# Altium footprint library PcbLib1.PcbLib: 7 footprints
Each footprint in its own frame and in the unit in brackets; x right, y up, seen from the top. Pads: shape width x height; smd on the part's side, far side on the other; paste and mask are expansions set on the pad; w line width, h text height; cw(c..) or ccw(c..) is an arc to the next point about the centre after c.
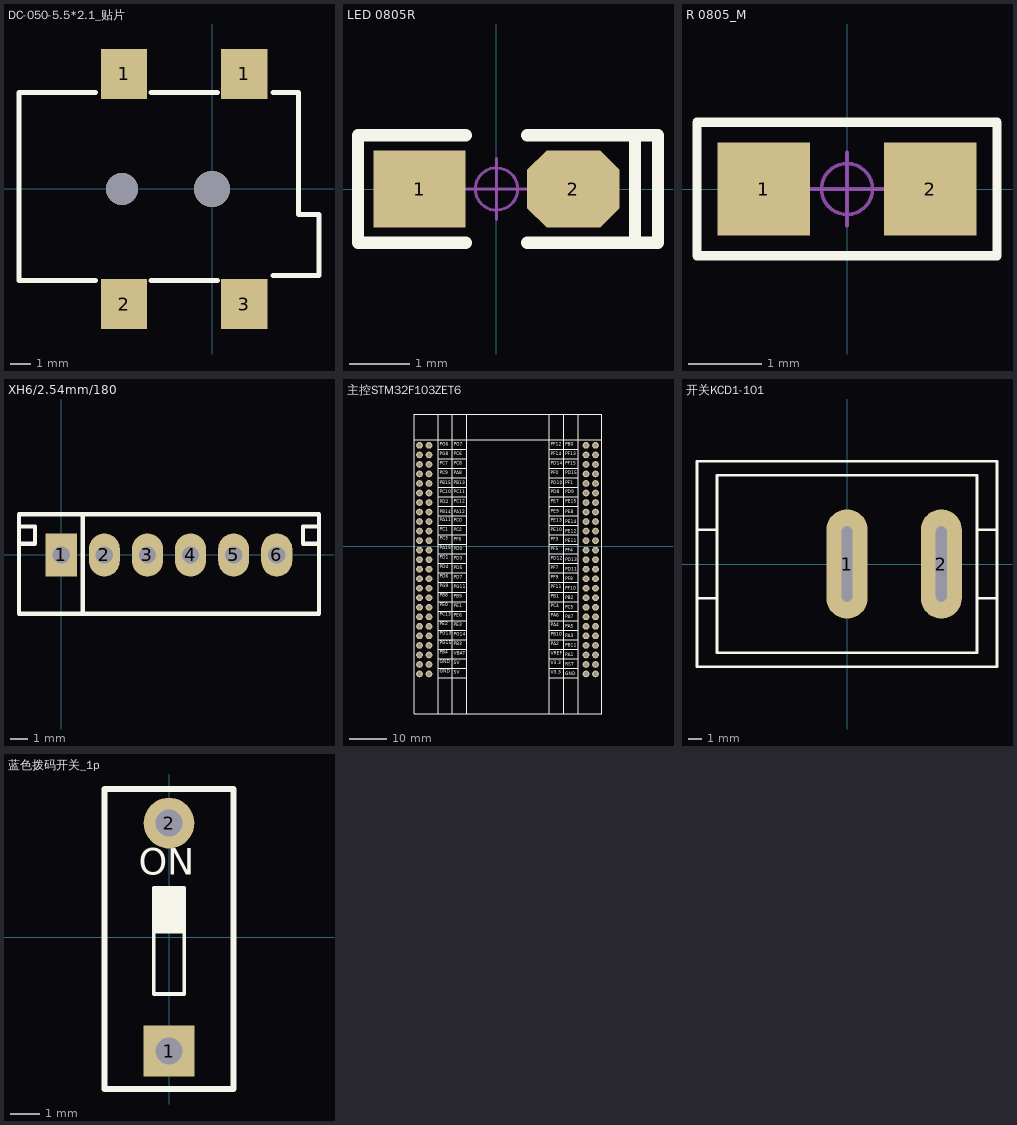
[diagram p0: the footprints below, top view; thin cyan lines are the x and y axes]

## DC-050-5.5*2.1_贴片 [mm] "5.5*2.1"
pads (4):
  rect 2.3x2.5 smd: 1(-4.4,5.75) 1(1.6,5.75) 2(-4.4,-5.75) 3(1.6,-5.75)
via 0,0 diameter 1.8 hole 1.8
via -4.5,0 diameter 1.6 hole 1.6
Top Overlay:
  lines w0.254: -5.842,-4.572 -9.652,-4.572 -9.652,4.826 -5.842,4.826 ; -3.048,-4.572 0.254,-4.572 ; -3.048,4.826 0.254,4.826 ; 3.048,-4.318 5.334,-4.318 5.334,-1.27 4.318,-1.27 4.318,4.826 3.048,4.826
3D body "DC-050.STEP": height 11, standoff -1.4, extent -9.593,-6.3 5.207,6.3

## LED 0805R [mil] "红色0805LED"
pads (2):
  rect 60x50 smd: 1(-50,0)
  oct 60x50 smd: 2(50,0)
Top Overlay:
  lines w8: -20,-35 -90,-35 -90,35 -20,35 ; 20,-35 105,-35 105,35 20,35 ; 90,-35 90,35
Mechanical 15:
  circle w1.97: c0,0 r13.78
  lines w1.97: -19.68,0 19.68,0 ; 0,-19.68 0,19.68
3D body "LED 0805玻璃罩.ST": height 31.69, standoff 12.01, extent -29.49,-24.65 29.49,24.65
3D body "LED 0805-R.STEP": height 26.33, standoff -0.16, extent -39.37,-24.65 39.37,24.64

## R 0805_M [mil] "1/8W贴片电阻"
pads (2):
  rect 50x50 smd: 1(-45,0) 2(45,0)
Top Overlay:
  lines w5: -81,-36 -81,36 81,36 81,-36 -81,-36
Mechanical 15:
  circle w1.97: c0,0 r13.78
  lines w1.97: -19.68,0 19.68,0 ; 0,-19.68 0,19.68
3D body "R 0805.STEP": height 19.72, standoff -0.24, extent -39.37,-24.61 39.37,24.61

## XH6/2.54mm/180 [mm]
pads (6):
  rect 1.8x2.5 hole 1: 1(0,0)
  oval 1.8x2.5 hole 1: 2(2.5,0) 3(5,0) 4(7.5,0) 5(10,0) 6(12.5,0)
Top Overlay:
  lines w0.254: -2.45,0.65 -1.524,0.65 -1.524,1.65 -2.45,1.65 ; 1.25,-3.4 1.25,2.35 ; 14.95,0.65 14.024,0.65 14.024,1.65 14.95,1.65 ; -2.45,-3.4 -2.45,2.35 14.95,2.35 14.95,-3.4 -2.45,-3.4
3D body "JST-B6B-XH-A.STEP": height 7, standoff -3.4, extent -2.45,-3.4 14.95,2.35

## 主控STM32F103ZET6 [mm]
pads (100):
  round 1.8 hole 1 paste+0: 1(124.029,26.924) 2(124.029,24.384) 3(124.029,21.844) 4(124.029,19.304) 5(124.029,16.764) 6(124.029,14.224) 7(124.029,11.684) 8(124.029,9.144) 9(124.029,6.604) 10(124.029,4.064) 11(124.029,1.524) 12(124.029,-1.016) 13(124.029,-3.556) 14(124.029,-6.096) 15(124.029,-8.636) 16(124.029,-11.176) 17(124.029,-13.716) 18(124.029,-16.256) 19(124.029,-18.796) 20(124.029,-21.336) 21(124.029,-23.876) 22(124.029,-26.416) 23(124.029,-28.956) 24(124.029,-31.496) 25(124.029,-34.036) 26(121.489,-34.036) 27(121.489,-31.496) 28(121.489,-28.956) 29(121.489,-26.416) 30(121.489,-23.876) 31(121.489,-21.336) 32(121.489,-18.796) 33(121.489,-16.256) 34(121.489,-13.716) 35(121.489,-11.176) 36(121.489,-8.636) 37(121.489,-6.096) 38(121.489,-3.556) 39(121.489,-1.016) 40(121.489,1.524) 41(121.489,4.064) 42(121.489,6.604) 43(121.489,9.144) 44(121.489,11.684) 45(121.489,14.224) 46(121.489,16.764) 47(121.489,19.304) 48(121.489,21.844) 49(121.489,24.384) 50(121.489,26.924) 51(79.629,26.924) 52(79.629,24.384) 53(79.629,21.844) 54(79.629,19.304) 55(79.629,16.764) 56(79.629,14.224) 57(79.629,11.684) 58(79.629,9.144) 59(79.629,6.604) 60(79.629,4.064) 61(79.629,1.524) 62(79.629,-1.016) 63(79.629,-3.556) 64(79.629,-6.096) 65(79.629,-8.636) 66(79.629,-11.176) 67(79.629,-13.716) 68(79.629,-16.256) 69(79.629,-18.796) 70(79.629,-21.336) 71(79.629,-23.876) 72(79.629,-26.416) 73(79.629,-28.956) 74(79.629,-31.496) 75(79.629,-34.036) 76(77.089,26.924) 77(77.089,24.384) 78(77.089,21.844) 79(77.089,19.304) 80(77.089,16.764) 81(77.089,14.224) 82(77.089,11.684) 83(77.089,9.144) 84(77.089,6.604) 85(77.089,4.064) 86(77.089,1.524) 87(77.089,-1.016) 88(77.089,-3.556) 89(77.089,-6.096) 90(77.089,-8.636) 91(77.089,-11.176) 92(77.089,-13.716) 93(77.089,-16.256) 94(77.089,-18.796) 95(77.089,-21.336) 96(77.089,-23.876) 97(77.089,-26.416) 98(77.089,-28.956) 99(77.089,-31.496) 100(77.089,-34.036)
Top Overlay:
  lines w0.254: 75.692,28.448 125.603,28.448 ; 82.08,-32.498 85.763,-32.498 ; 82.08,-29.958 85.763,-29.958 ; 82.08,-27.418 85.763,-27.418 ; 82.08,-24.878 85.763,-24.878 ; 82.08,-22.338 85.763,-22.338 ; 82.08,-19.798 85.763,-19.798 ; 82.08,-17.258 85.763,-17.258 ; 82.08,-14.718 85.763,-14.718 ; 82.08,-12.178 85.763,-12.178 ; 82.08,-9.638 85.763,-9.638 ; 82.08,-7.098 85.763,-7.098 ; 82.08,-4.558 85.763,-4.558 ; 82.08,-2.018 85.763,-2.018 ; 82.08,0.522 85.763,0.522 ; 82.08,3.062 85.763,3.062 ; 82.08,5.602 85.763,5.602 ; 82.08,8.142 85.763,8.142 ; 82.08,10.682 85.763,10.682 ; 82.08,13.222 85.763,13.222 ; 82.08,15.762 85.763,15.762 ; 82.08,18.302 85.763,18.302 ; 82.08,20.842 85.763,20.842 ; 82.08,25.922 85.763,25.922 ; 82.08,28.462 85.763,28.462 ; 85.89,-32.498 89.573,-32.498 ; 85.89,-29.958 89.573,-29.958 ; 85.89,-27.418 89.573,-27.418 ; 85.89,-24.878 89.573,-24.878 ; 85.89,-22.338 89.573,-22.338 ; 85.89,-19.798 89.573,-19.798 ; 85.89,-17.258 89.573,-17.258 ; 85.89,-14.718 89.573,-14.718 ; 85.89,-12.178 89.573,-12.178 ; 85.89,-9.638 89.573,-9.638 ; 85.89,-7.098 89.573,-7.098 ; 85.89,-4.558 89.573,-4.558 ; 85.89,-2.018 89.573,-2.018 ; 85.89,0.522 89.573,0.522 ; 85.89,3.062 89.573,3.062 ; 85.89,5.602 89.573,5.602 ; 85.89,8.142 89.573,8.142 ; 85.89,10.682 89.573,10.682 ; 85.89,13.222 89.573,13.222 ; 85.89,15.762 89.573,15.762 ; 85.89,18.302 89.573,18.302 ; 85.89,20.842 89.573,20.842 ; 85.89,25.922 89.573,25.922 ; 85.89,28.462 89.573,28.462 ; 111.76,-32.498 115.443,-32.498 ; 111.76,-29.958 115.443,-29.958 ; 111.76,-27.418 115.443,-27.418 ; 111.76,-24.878 115.443,-24.878 ; 111.76,-22.338 115.443,-22.338 ; 111.76,-19.798 115.443,-19.798 ; 111.76,-17.258 115.443,-17.258 ; 111.76,-14.718 115.443,-14.718 ; 111.76,-12.178 115.443,-12.178 ; 111.76,-9.638 115.443,-9.638 ; 111.76,-7.098 115.443,-7.098 ; 111.76,-4.558 115.443,-4.558 ; 111.76,-2.018 115.443,-2.018 ; 111.76,0.522 115.443,0.522 ; 111.76,3.062 115.443,3.062 ; 111.76,5.602 115.443,5.602 ; 111.76,8.142 115.443,8.142 ; 111.76,10.682 115.443,10.682 ; 111.76,13.222 115.443,13.222 ; 111.76,15.762 115.443,15.762 ; 111.76,18.302 115.443,18.302 ; 111.76,20.842 115.443,20.842 ; 111.76,25.922 115.443,25.922 ; 111.76,28.462 115.443,28.462 ; 115.57,-32.498 119.253,-32.498 ; 115.57,-29.958 119.253,-29.958 ; 115.57,-27.418 119.253,-27.418 ; 115.57,-24.878 119.253,-24.878 ; 115.57,-22.338 119.253,-22.338 ; 115.57,-19.798 119.253,-19.798 ; 115.57,-17.258 119.253,-17.258 ; 115.57,-14.718 119.253,-14.718 ; 115.57,-12.178 119.253,-12.178 ; 115.57,-9.638 119.253,-9.638 ; 115.57,-7.098 119.253,-7.098 ; 115.57,-4.558 119.253,-4.558 ; 115.57,-2.018 119.253,-2.018 ; 115.57,0.522 119.253,0.522 ; 115.57,3.062 119.253,3.062 ; 115.57,5.602 119.253,5.602 ; 115.57,8.142 119.253,8.142 ; 115.57,10.682 119.253,10.682 ; 115.57,13.222 119.253,13.222 ; 115.57,15.762 119.253,15.762 ; 115.57,18.302 119.253,18.302 ; 115.57,20.842 119.253,20.842 ; 115.57,25.922 119.253,25.922 ; 115.57,28.462 119.253,28.462 ; 75.692,-44.71 125.692,-44.71 125.692,35.29 75.692,35.29 ; 75.692,-44.71 75.692,35.29 ; 75.692,-44.71 75.692,35.29 ; 85.852,-44.71 89.662,-44.71 89.662,35.29 85.852,35.29 ; 85.852,-44.71 85.852,35.29 ; 85.852,-44.71 85.852,35.29 ; 85.852,-44.71 85.852,35.29 ; 85.852,-44.71 82.042,-44.71 82.042,35.29 85.852,35.29 ; 115.532,-44.71 115.532,35.29 ; 115.532,-44.71 111.722,-44.71 111.722,35.29 115.532,35.29 ; 115.532,-44.71 115.532,35.29 ; 115.532,-44.71 119.38,-44.71 119.38,28.448 119.38,35.29 115.532,35.29 ; 82.08,-35.038 85.763,-35.038 82.08,-35.038 ; 82.08,23.382 85.763,23.382 82.08,23.382 ; 85.89,-35.038 89.573,-35.038 85.89,-35.038 ; 85.89,23.382 89.573,23.382 85.89,23.382 ; 111.76,-35.038 115.443,-35.038 111.76,-35.038 ; 111.76,23.382 115.443,23.382 111.76,23.382 ; 115.57,-35.038 119.253,-35.038 115.57,-35.038 ; 115.57,23.382 119.253,23.382 115.57,23.382
  text "PF12" at 112.141,26.392 h1.52
  text "PF14" at 112.141,23.852 h1.52
  text "PD14" at 112.141,21.312 h1.52
  text "PF0" at 112.141,18.785 h1.52
  text "PD10" at 112.141,16.118 h1.52
  text "PD8" at 112.141,13.705 h1.52
  text "PE7" at 112.141,11.165 h1.52
  text "PE9" at 112.141,8.498 h1.52
  text "PG7" at 86.271,26.405 h1.52
  text "PC6" at 86.271,23.865 h1.52
  text "PC8" at 86.271,21.325 h1.52
  text "PA8" at 86.271,18.785 h1.52
  text "PB13" at 86.271,16.118 h1.52
  text "PC11" at 86.271,13.705 h1.52
  text "PC12" at 86.271,11.165 h1.52
  text "PA12" at 86.271,8.485 h1.52
  text "PB0" at 115.951,26.405 h1.52
  text "PF13" at 115.951,23.865 h1.52
  text "PF15" at 115.951,21.325 h1.52
  text "PD15" at 115.951,18.785 h1.52
  text "PF1" at 115.951,16.105 h1.52
  text "PD9" at 115.951,13.705 h1.52
  text "PE15" at 115.951,11.165 h1.52
  text "PG6" at 82.461,26.405 h1.52
  text "PG8" at 82.461,23.865 h1.52
  text "PC7" at 82.461,21.325 h1.52
  text "PC9" at 82.461,18.785 h1.52
  text "PB15" at 82.461,16.118 h1.52
  text "PC10" at 82.461,13.705 h1.52
  text "PD2" at 82.461,11.152 h1.52
  text "PB14" at 82.461,8.485 h1.52
  text "PA11" at 82.461,6.326 h1.52
  text "PC3" at 82.461,1.386 h1.52
  text "PA15" at 82.461,-1.154 h1.52
  text "PD1" at 82.461,-3.707 h1.52
  text "PD4" at 82.461,-6.247 h1.52
  text "PD6" at 82.461,-8.774 h1.52
  text "PG9" at 82.461,-11.314 h1.52
  text "PB8" at 82.461,-13.854 h1.52
  text "PE0" at 82.461,-16.394 h1.52
  text "PC13" at 82.461,-18.934 h1.52
  text "PE2" at 82.461,-21.487 h1.52
  text "PG13" at 82.461,-24.014 h1.52
  text "PG15" at 82.461,-26.554 h1.52
  text "PB4" at 82.461,-29.107 h1.52
  text "GND" at 82.461,-31.634 h1.52
  text "GND" at 82.461,-34.174 h1.52
  text "PC1" at 82.461,3.799 h1.52
  text "PC0" at 86.271,6.212 h1.52
  text "PC2" at 86.271,3.672 h1.52
  text "PF6" at 86.271,1.132 h1.52
  text "PD0" at 86.271,-1.408 h1.52
  text "PD3" at 86.271,-3.948 h1.52
  text "PD5" at 86.271,-6.488 h1.52
  text "PD7" at 86.271,-9.028 h1.52
  text "PG11" at 86.271,-11.568 h1.52
  text "PB9" at 86.271,-14.108 h1.52
  text "PE1" at 86.271,-16.661 h1.52
  text "PE6" at 86.271,-19.188 h1.52
  text "PE3" at 86.271,-21.728 h1.52
  text "PG14" at 86.271,-24.268 h1.52
  text "PB3" at 86.271,-26.808 h1.52
  text "VBAT" at 86.271,-29.361 h1.52
  text "5V" at 86.271,-31.888 h1.52
  text "5V" at 86.271,-34.428 h1.52
  text "PE13" at 112.052,6.212 h1.52
  text "PE10" at 112.052,3.672 h1.52
  text "PF3" at 112.052,1.132 h1.52
  text "PF5" at 112.052,-1.408 h1.52
  text "PD12" at 112.052,-3.961 h1.52
  text "PF7" at 112.052,-6.488 h1.52
  text "PF9" at 112.052,-9.028 h1.52
  text "PF11" at 112.052,-11.581 h1.52
  text "PB1" at 112.052,-14.121 h1.52
  text "PC4" at 112.052,-16.648 h1.52
  text "PA6" at 112.052,-19.188 h1.52
  text "PA4" at 112.052,-21.741 h1.52
  text "PB10" at 112.052,-24.268 h1.52
  text "PA2" at 112.052,-26.821 h1.52
  text "V3.3" at 112.052,-34.423 h1.52
  text "VREF" at 112.052,-29.361 h1.52
  text "V3.3" at 112.052,-31.883 h1.52
  text "PE8" at 115.951,8.371 h1.52
  text "PE14" at 115.951,5.818 h1.52
  text "PE12" at 115.951,3.278 h1.52
  text "PE11" at 115.951,0.738 h1.52
  text "PF4" at 115.951,-1.802 h1.52
  text "PD13" at 115.951,-4.329 h1.52
  text "PD11" at 115.951,-6.882 h1.52
  text "PF8" at 115.951,-9.409 h1.52
  text "PF10" at 115.951,-11.949 h1.52
  text "PB2" at 115.951,-14.502 h1.52
  text "PC5" at 115.951,-17.029 h1.52
  text "PA7" at 115.951,-19.569 h1.52
  text "PA5" at 115.951,-22.109 h1.52
  text "PA3" at 115.951,-24.649 h1.52
  text "PB11" at 115.951,-27.202 h1.52
  text "PA1" at 115.951,-29.742 h1.52
  text "RST" at 115.952,-32.269 h1.52
  text "GND" at 115.951,-34.809 h1.52

## 开关KCD1-101 [mm] "船型开关立式"
pads (2):
  oval 3x8 hole 0.8 slot 5.5 at 90 deg: 1(0,0) 2(6.9,0)
Top Overlay:
  lines w0.203: -10.973,-2.5 -9.5,-2.5 ; -10.973,2.5 -9.5,2.5 ; 9.5,-2.5 10.973,-2.5 ; 9.5,2.5 10.973,2.5 ; -10.973,-7.518 10.973,-7.518 10.973,7.518 -10.973,7.518 -10.973,-7.518 ; -9.5,-6.5 9.5,-6.5 9.5,6.5 -9.5,6.5 -9.5,-6.5
3D body "KCD1-101.STEP": height 20.3, standoff -5.8, extent -10.951,-7.5 10.95,7.5

## 蓝色拨码开关_1p [mm] "4.1*9.9*7mm"
pads (2):
  rect 1.7x1.7 hole 0.9: 1(0,-3.81)
  round 1.7 hole 0.9: 2(0,3.81)
Top Overlay:
  rectangle: -0.508,0.127 0.508,1.651
  lines w0.127: -0.508,-1.905 0.508,-1.905 0.508,1.651 -0.508,1.651 -0.508,-1.905
  lines w0.2: -2.159,-5.08 2.159,-5.08 2.159,4.953 -2.159,4.953 -2.159,-5.08
  text "ON" at -1.016,1.778 h1.52
3D body "DIP-1P.STEP": height 6.65, standoff -3.15, extent -2.068,-4.953 2.032,4.947